# Altium footprint library NDLib.PCBLIB: 499 footprints (part 16 of 32)
Each footprint in its own frame and in the unit in brackets; x right, y up, seen from the top. Pads: shape width x height; smd on the part's side, far side on the other; paste and mask are expansions set on the pad; w line width, h text height; cw(c..) or ccw(c..) is an arc to the next point about the centre after c.
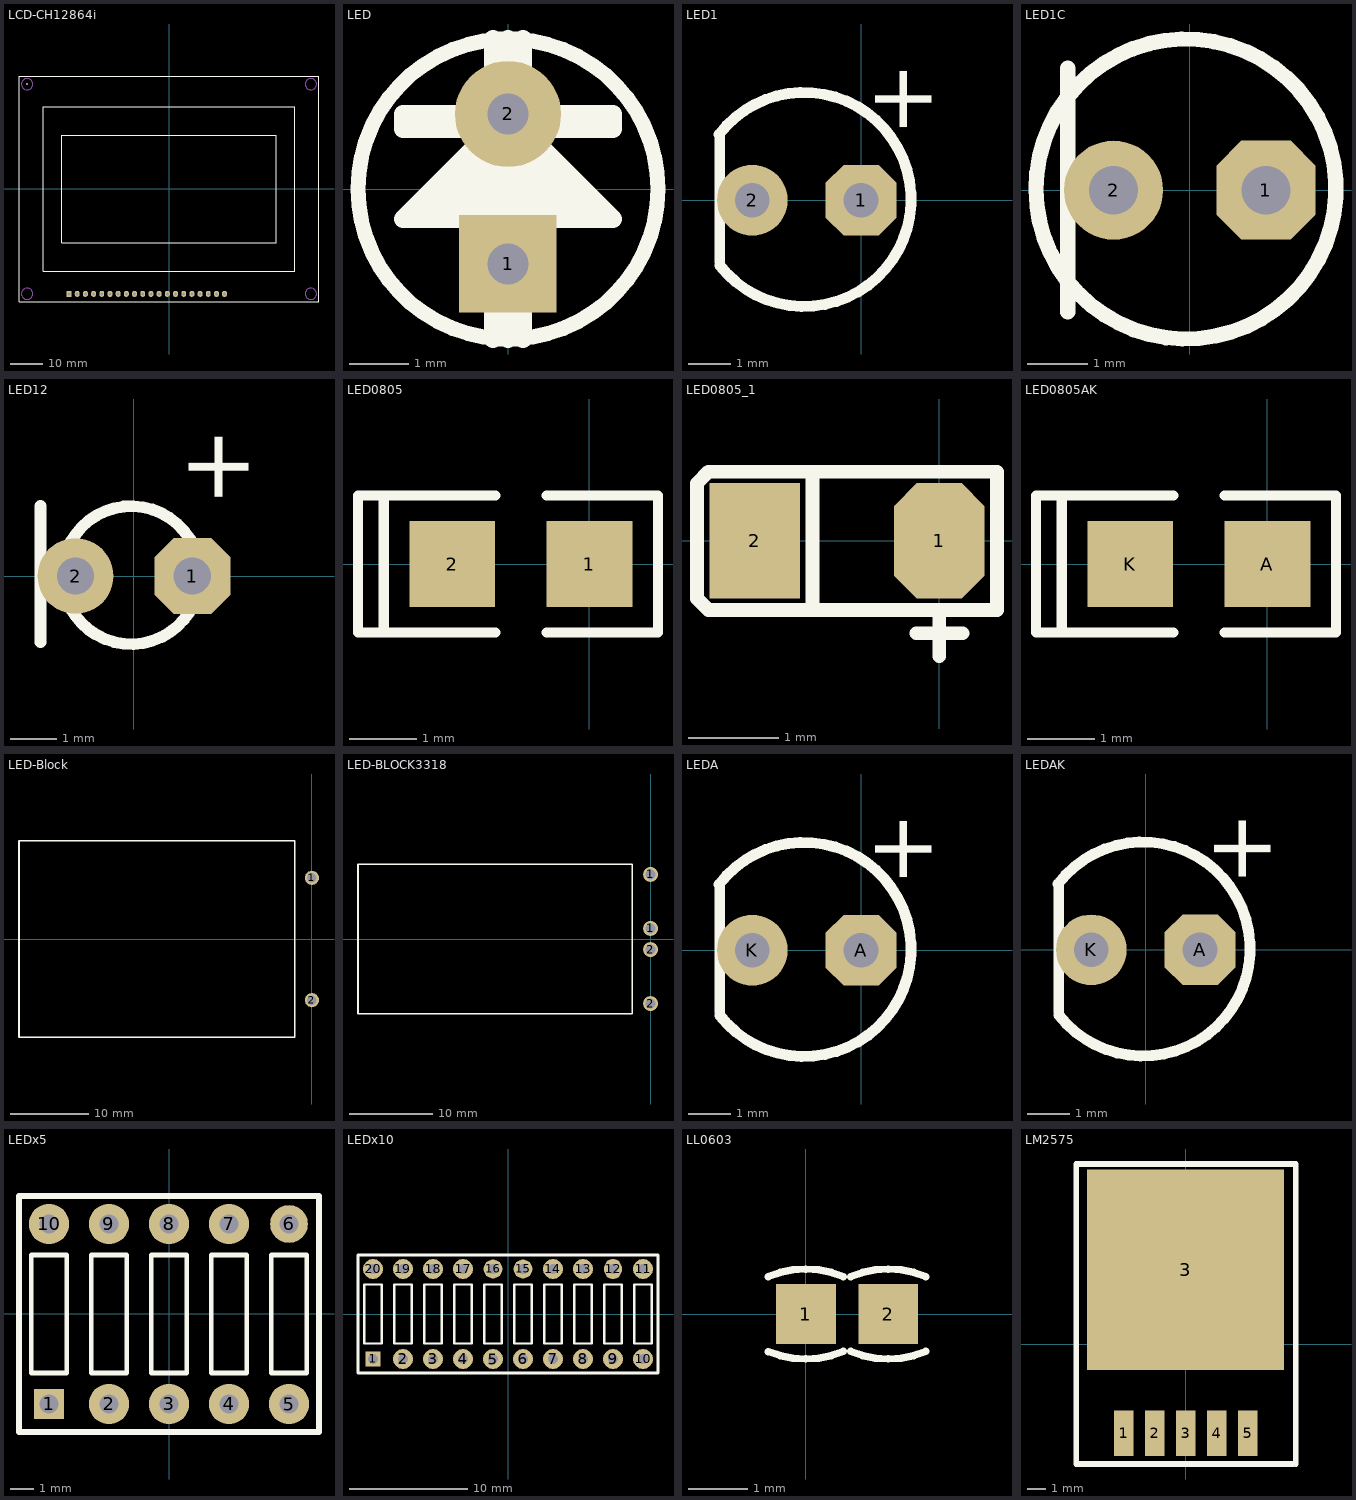
[diagram p15: the footprints below, top view; thin cyan lines are the x and y axes]

## LCD-CH12864i [mil]
height 196.85
pads (20):
  oval 60x75 hole 36: 1(677.16,-1279.53) 2(579.52,-1279.53) 3(479.52,-1279.53) 4(379.52,-1279.53) 5(279.52,-1279.53) 6(179.52,-1279.53) 7(79.52,-1279.53) 8(-20.48,-1279.53) 9(-120.48,-1279.53) 10(-220.48,-1279.53) 11(-320.48,-1279.53) 12(-420.48,-1279.53) 13(-520.48,-1279.53) 14(-620.48,-1279.53) 15(-720.48,-1279.53) 16(-820.48,-1279.53) 17(-920.48,-1279.53) 18(-1020.48,-1279.53) 19(-1120.48,-1279.53)
  rect 60x75 hole 36: 20(-1220.48,-1279.53)
via -1732.28,1279.51 diameter 24 hole 16
TopOverlay:
  lines w10: -1830.71,-1377.96 -1830.71,1377.95 1830.71,1377.95 1830.71,-1377.96 -1830.71,-1377.96 ; -1535.43,-1003.94 -1535.43,1003.94 1535.43,1003.94 1535.43,-1003.94 -1535.43,-1003.94 ; -1309.45,-654.33 -1309.45,654.33 1309.45,654.33 1309.45,-654.33 -1309.45,-654.33
Mechanical1:
  circle w10: c-1732.28,-1279.52 r68.9
  circle w10: c-1732.28,1279.51 r68.9
  circle w10: c1732.27,1279.51 r68.9
  circle w10: c1732.27,-1279.52 r68.9

## LED [mm]
pads (2):
  rect 1.651x1.651 hole 0.7: 1(-0.004,-1.263)
  round 1.8 hole 0.7: 2(-0.004,1.277)
TopOverlay:
  circle w0.254: c-0.004,0.007 r2.54
  lines w0.305: -1.528,-0.501 -0.004,1.023 1.52,-0.501 ; -1.274,-0.501 -0.004,0.769 1.266,-0.501 ; -1.02,-0.501 -0.004,0.515 1.012,-0.501 ; -0.766,-0.501 -0.004,0.261 0.758,-0.501 ; -0.512,-0.501 -0.004,0.007 0.504,-0.501 ; -0.258,-2.533 -0.258,-1.263 ; -0.258,1.277 -0.258,2.547 ; -0.004,-2.533 -0.004,-1.263 ; -0.004,2.547 -0.004,1.277 ; 0.25,-2.533 0.25,-1.263 ; 0.25,1.277 0.25,2.547 ; -0.004,1.277 1.774,-0.501 -1.782,-0.501 -0.004,1.277 ; -1.782,1.023 -1.782,1.277 1.774,1.277 1.774,1.023 -1.782,1.023
  lines w0.5: -0.004,-0.501 -0.004,1.277

## LED1 [mil]
pads (2):
  oct 65x65 hole 32: 1(0,0)
  round 65 hole 32: 2(-100,0)
TopOverlay:
  lines w10: -130.67,60.51 cw(c-52.46,0.75) -129.93,-59.95 ; -130,-56.62 -130,60
  text "+" at 65.02,58.33 h60

## LED1C [mil]
pads (2):
  oct 65x65 hole 32: 1(50,0)
  round 65 hole 32: 2(-50,0)
TopOverlay:
  lines w10: -80,-80 -80,80 ; -79.93,-59.95 ccw(c-2.46,0.75) -79.93,-59.95

## LED12 [mil]
height 590.55
pads (2):
  oct 65x65 hole 32: 1(50,0)
  round 65 hole 32: 2(-50,0)
TopOverlay:
  circle w10: c-2.46,0.75 r59.06
  lines w10: -80,-56.62 -80,60
  text "+" at 98.43,59.06 h60
BottomOverlay:
  circle w19.68: c0,0 r98.43

## LED0805 [mil]
pads (2):
  rect 50x50 smd: 1(0,0) 2(-80,0)
TopOverlay:
  lines w6: -120,-40 -120,40 ; -55,-40 -135,-40 -135,40 -55,40 ; -25,-40 40,-40 40,40 -25,40

## LED0805_1 [mm]
pads (2):
  oct 1x1.27 smd: 1(0,0)
  rect 1x1.27 smd: 2(-2.032,0)
TopOverlay:
  lines w0.152: -1.397,-0.711 -1.397,0.762 -2.54,0.762 ; -0.254,-1.016 0.254,-1.016 ; 0,-1.27 0,-0.762 ; -2.54,0.762 -2.667,0.635 -2.667,-0.635 -2.54,-0.762 0.635,-0.762 0.635,0.762 -2.54,0.762

## LED0805AK [mil]
pads (2):
  rect 50x50 smd: A(0,0) K(-80,0)
TopOverlay:
  lines w6: -120,-40 -120,40 ; -55,-40 -135,-40 -135,40 -55,40 ; -25,-40 40,-40 40,40 -25,40

## LED-Block [mm]
height 2
pads (2):
  round 1.8 hole 1.2: 1(0,7.768) 2(0,-7.768)
TopOverlay:
  lines w0.2: -37.2,-12.5 -37.2,12.5 -2.2,12.5 -2.2,-12.5 -37.2,-12.5

## LED-BLOCK3318 [mm]
height 2
pads (4):
  round 1.8 hole 1.2: 1(0,1.27) 1(0,7.768) 2(0,-7.768) 2(0,-1.27)
TopOverlay:
  lines w0.2: -35.2,-9 -35.2,9 -2.2,9 -2.2,-9 -35.2,-9

## LEDA [mil]
pads (2):
  oct 65x65 hole 32: A(0,0)
  round 65 hole 32: K(-100,0)
TopOverlay:
  lines w10: -130.67,60.51 cw(c-52.46,0.75) -129.93,-59.95 ; -130,-56.62 -130,60
  text "+" at 65.02,58.33 h60

## LEDAK [mil]
pads (2):
  oct 65x65 hole 32: A(50,0)
  round 65 hole 32: K(-50,0)
TopOverlay:
  lines w10: -80.67,60.51 cw(c-2.46,0.75) -79.93,-59.95 ; -80,-56.62 -80,60
  text "+" at 115.02,58.33 h60
BottomOverlay:
  circle w19.68: c0,0 r98.43

## LEDx5 [mm]
pads (10):
  rect 1.27x1.27 hole 0.813: 1(-5.08,-3.81)
  round 1.7 hole 0.813: 2(-2.54,-3.81) 3(0,-3.81) 4(2.54,-3.81) 5(5.08,-3.81) 7(2.54,3.81) 8(0,3.81) 9(-2.54,3.81) 10(-5.08,3.81)
  round 1.6 hole 0.813: 6(5.08,3.81)
TopOverlay:
  lines w0.2: -5.83,-2.5 -5.83,2.5 -4.33,2.5 -4.33,-2.5 -5.83,-2.5 ; -3.29,-2.5 -1.79,-2.5 -1.79,2.5 -3.29,2.5 -3.29,-2.5 ; -0.75,-2.5 0.75,-2.5 0.75,2.5 -0.75,2.5 -0.75,-2.5 ; 1.79,-2.5 3.29,-2.5 3.29,2.5 1.79,2.5 1.79,-2.5 ; 4.33,-2.5 4.33,2.5 5.83,2.5 5.83,-2.5 4.33,-2.5
  lines w0.254: -6.35,-5 -6.35,5 6.35,5 6.35,-5 -6.35,-5

## LEDx10 [mm]
pads (20):
  rect 1.27x1.27 hole 0.813: 1(-11.43,-3.81)
  round 1.7 hole 0.813: 2(-8.89,-3.81) 3(-6.35,-3.81) 4(-3.81,-3.81) 5(-1.27,-3.81) 6(1.27,-3.81) 7(3.81,-3.81) 8(6.35,-3.81) 9(8.89,-3.81) 10(11.43,-3.81) 11(11.43,3.81) 13(6.35,3.81) 14(3.81,3.81) 17(-3.81,3.81) 18(-6.35,3.81) 19(-8.89,3.81) 20(-11.43,3.81)
  oval 1.5x1.7 hole 0.813: 12(8.89,3.81)
  round 1.6 hole 0.813: 15(1.27,3.81) 16(-1.27,3.81)
TopOverlay:
  lines w0.2: -12.18,-2.5 -12.18,2.5 -10.68,2.5 -10.68,-2.5 -12.18,-2.5 ; -9.64,-2.5 -8.14,-2.5 -8.14,2.5 -9.64,2.5 -9.64,-2.5 ; -7.1,-2.5 -5.6,-2.5 -5.6,2.5 -7.1,2.5 -7.1,-2.5 ; -4.56,-2.5 -3.06,-2.5 -3.06,2.5 -4.56,2.5 -4.56,-2.5 ; -2.02,-2.5 -2.02,2.5 -0.52,2.5 -0.52,-2.5 -2.02,-2.5 ; 0.52,-2.5 0.52,2.5 2.02,2.5 2.02,-2.5 0.52,-2.5 ; 3.06,-2.5 4.56,-2.5 4.56,2.5 3.06,2.5 3.06,-2.5 ; 5.6,-2.5 5.6,2.5 7.1,2.5 7.1,-2.5 5.6,-2.5 ; 8.14,-2.5 8.14,2.5 9.64,2.5 9.64,-2.5 8.14,-2.5 ; 10.68,-2.5 12.18,-2.5 12.18,2.5 10.68,2.5 10.68,-2.5
  lines w0.254: -12.7,-5 -12.7,5 12.7,5 12.7,-5 -12.7,-5

## LL0603 [mil]
pads (2):
  rect 40x40 smd: 1(0,0) 2(55,0)
TopOverlay:
  lines w5: -25,-25 ccw(c0,35) 25,-25 ; -25,25 cw(c0,-35) 25,25 ; 30,-25 ccw(c55,35) 80,-25 ; 30,25 cw(c55,-35) 80,25

## LM2575 [mm] "Power Scource"
height 6
pads (6):
  rect 1.07x2.5 smd: 1(-3.4,-4.889) 2(-1.7,-4.89) 3(0,-4.89) 4(1.7,-4.889) 5(3.4,-4.889)
  rect 10.8x11 smd: 3(0,4.095)
TopOverlay:
  lines w0.127: 6.045,9.886 ccw(c6.045,9.886) 6.045,9.886
  lines w0.305: 5.893,-6.566 -5.994,-6.566 -5.994,-4.889 -5.994,9.886 6.045,9.886 6.045,-6.566